# Altium footprint library General_Lib.PcbLib: 729 footprints (part 44 of 46)
Each footprint in its own frame and in the unit in brackets; x right, y up, seen from the top. Pads: shape width x height; smd on the part's side, far side on the other; paste and mask are expansions set on the pad; w line width, h text height; cw(c..) or ccw(c..) is an arc to the next point about the centre after c.
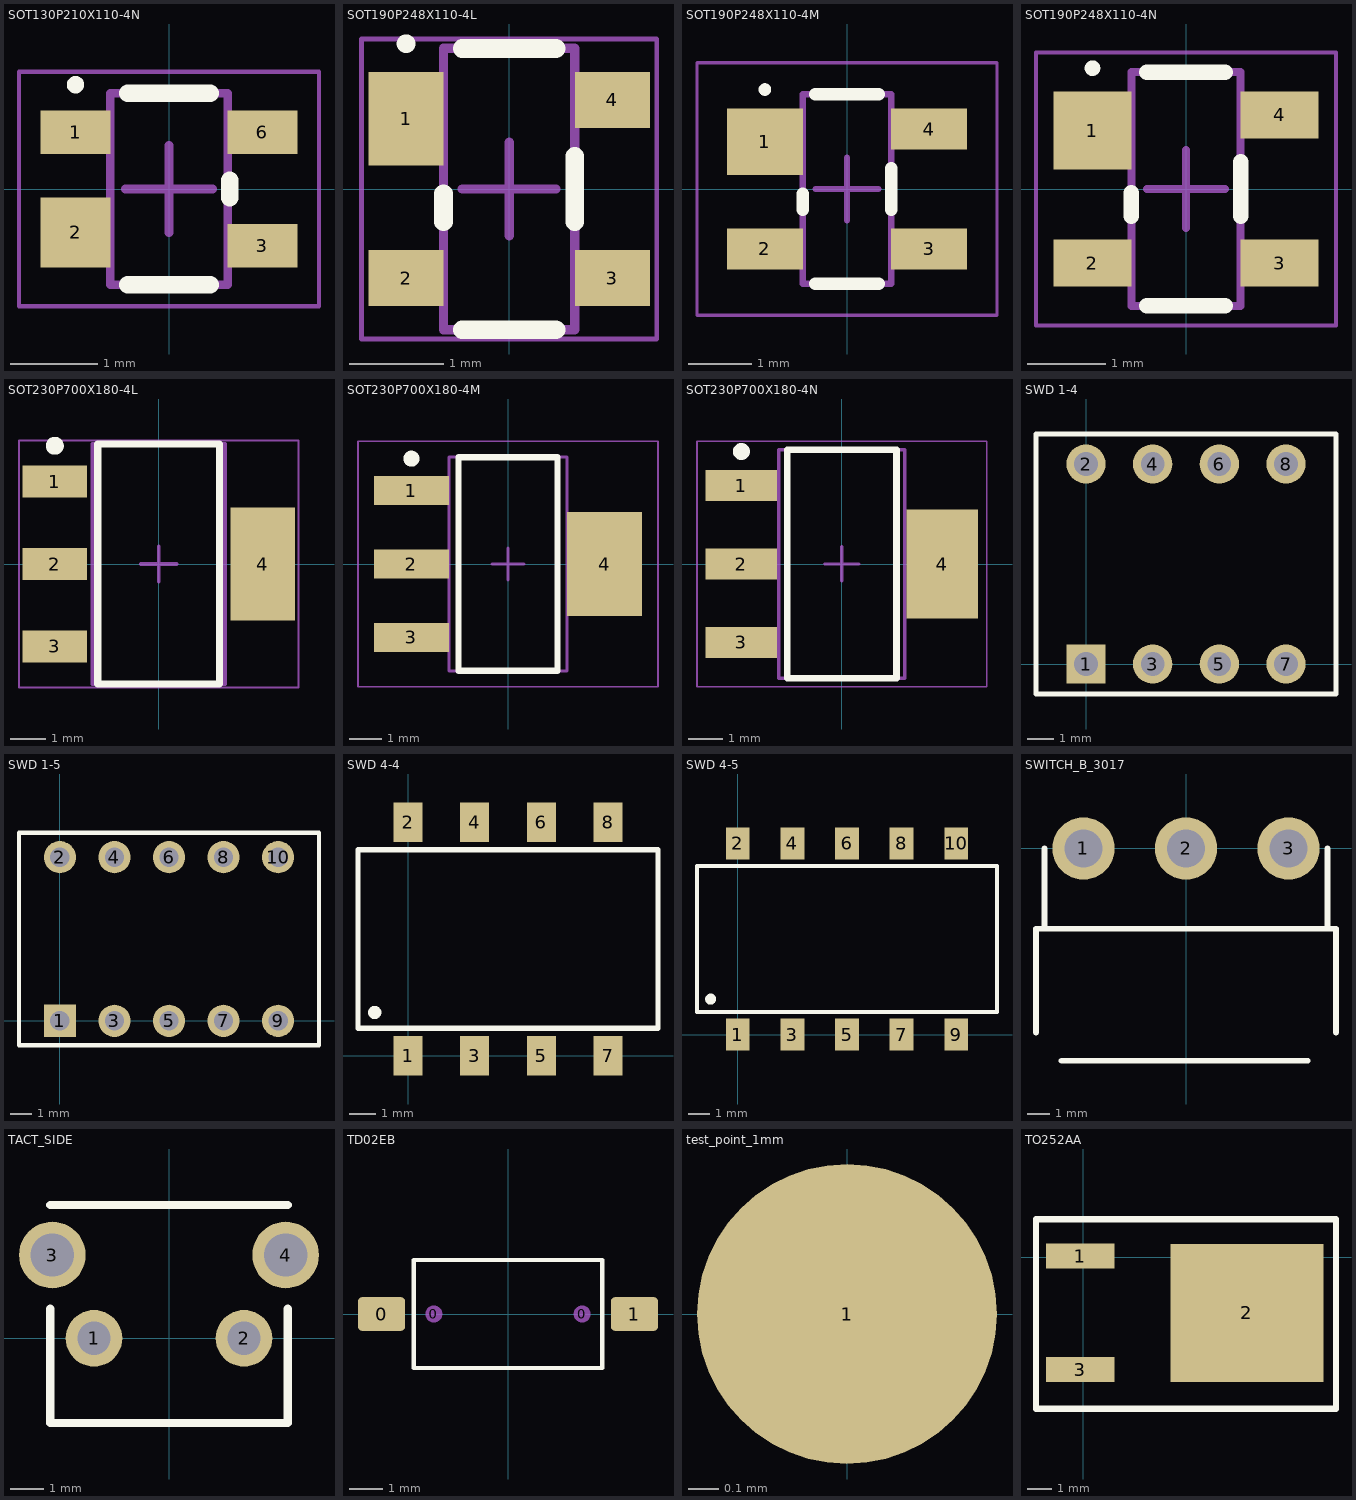
[diagram p43: the footprints below, top view; thin cyan lines are the x and y axes]

## SOT130P210X110-4N [mm] "SOT343, 4-Leads, Body 2,00x2,10mm, Pitch 1,30mm, IPC Medium Density"
height 1.1
pads (4):
  rect 0.8x0.5 smd: 1(-1.075,0.65) 3(1.075,-0.65) 6(1.075,0.65)
  rect 0.8x0.8 smd: 2(-1.075,-0.5)
Top Overlay:
  circle w0.1: c-1.075,1.2 r0.05
  lines w0.2: -0.475,-1.1 0.475,-1.1 ; -0.475,1.1 0.475,1.1 ; 0.7,-0.1 0.7,0.1
Mechanical 13:
  lines w0.1: -0.675,-1.1 0.675,-1.1 0.675,1.1 -0.675,1.1 -0.675,-1.1
Mechanical 15:
  lines w0.05: -1.725,-1.35 1.725,-1.35 1.725,1.35 -1.725,1.35 -1.725,-1.35
  lines w0.1: -0.5,0 0.5,0 ; 0,-0.5 0,0.5
3D body "SOT130P210X110-4N.step": height 1.1, standoff 0, extent -1.225,-1.1 1.225,1.1

## SOT190P248X110-4L [mm] "SOT143, 4-Leads, Body 2,90x2,48mm, Pitch 1,90mm, IPC High Density"
height 1.1
pads (4):
  rect 0.8x1 smd: 1(-1.1,0.75)
  rect 0.8x0.6 smd: 2(-1.1,-0.95) 3(1.1,-0.95) 4(1.1,0.95)
Top Overlay:
  circle w0.1: c-1.1,1.55 r0.05
  lines w0.2: -0.7,-0.35 -0.7,-0.05 ; -0.5,-1.5 0.5,-1.5 ; -0.5,1.5 0.5,1.5 ; 0.7,-0.35 0.7,0.35
Mechanical 13:
  lines w0.1: -0.7,-1.5 0.7,-1.5 0.7,1.5 -0.7,1.5 -0.7,-1.5
Mechanical 15:
  lines w0.05: -1.575,-1.6 1.575,-1.6 1.575,1.6 -1.575,1.6 -1.575,-1.6
  lines w0.1: -0.5,0 0.5,0 ; 0,-0.5 0,0.5
3D body "SOT190P248X110-4L.step": height 1.1, standoff 0, extent -1.238,-1.5 1.238,1.5

## SOT190P248X110-4M [mm] "SOT143, 4-Leads, Body 2,90x2,48mm, Pitch 1,90mm, IPC Low Density"
height 1.1
pads (4):
  rect 1.2x1.05 smd: 1(-1.3,0.75)
  rect 1.2x0.65 smd: 2(-1.3,-0.95) 3(1.3,-0.95) 4(1.3,0.95)
Top Overlay:
  circle w0.1: c-1.3,1.575 r0.05
  lines w0.2: -0.7,-0.325 -0.7,-0.075 ; -0.5,-1.5 0.5,-1.5 ; -0.5,1.5 0.5,1.5 ; 0.7,-0.325 0.7,0.325
Mechanical 13:
  lines w0.1: -0.7,-1.5 0.7,-1.5 0.7,1.5 -0.7,1.5 -0.7,-1.5
Mechanical 15:
  lines w0.05: -2.375,-2 2.375,-2 2.375,2 -2.375,2 -2.375,-2
  lines w0.1: -0.5,0 0.5,0 ; 0,-0.5 0,0.5
3D body "SOT190P248X110-4M.step": height 1.1, standoff 0, extent -1.238,-1.5 1.238,1.5

## SOT190P248X110-4N [mm] "SOT143, 4-Leads, Body 2,90x2,48mm, Pitch 1,90mm, IPC Medium Density"
height 1.1
pads (4):
  rect 1x1 smd: 1(-1.2,0.75)
  rect 1x0.6 smd: 2(-1.2,-0.95) 3(1.2,-0.95) 4(1.2,0.95)
Top Overlay:
  circle w0.1: c-1.2,1.55 r0.05
  lines w0.2: -0.7,-0.35 -0.7,-0.05 ; -0.5,-1.5 0.5,-1.5 ; -0.5,1.5 0.5,1.5 ; 0.7,-0.35 0.7,0.35
Mechanical 13:
  lines w0.1: -0.7,-1.5 -0.7,1.5 0.7,1.5 0.7,-1.5 -0.7,-1.5
Mechanical 15:
  lines w0.05: -1.925,-1.75 -1.925,1.75 1.925,1.75 1.925,-1.75 -1.925,-1.75
  lines w0.1: -0.5,0 0.5,0 ; 0,-0.5 0,0.5
3D body "SOT190P248X110-4N.step": height 1.1, standoff 0, extent -1.238,-1.5 1.238,1.5

## SOT230P700X180-4L [mm] "SOT223, 4-Leads, Body 6,50x7,00mm (avg), Pitch 2,30mm, IPC High Density"
height 1.8
pads (4):
  rect 1.8x0.9 smd: 1(-2.9,2.3) 2(-2.9,0) 3(-2.9,-2.3)
  rect 1.8x3.15 smd: 4(2.9,0)
Top Overlay:
  circle w0.25: c-2.9,3.3 r0.125
  lines w0.2: -1.7,-3.35 -1.7,3.35 1.7,3.35 1.7,-3.35 -1.7,-3.35
Mechanical 13:
  lines w0.1: -1.85,-3.35 -1.85,3.35 1.85,3.35 1.85,-3.35 -1.85,-3.35
Mechanical 15:
  lines w0.05: -3.9,-3.45 -3.9,3.45 3.9,3.45 3.9,-3.45 -3.9,-3.45
  lines w0.1: -0.5,0 0.5,0 ; 0,-0.5 0,0.5
3D body "SOT230P700X180-4L.step": height 1.8, standoff 0, extent -3.5,-3.35 3.5,3.35

## SOT230P700X180-4M [mm] "SOT223, 4-Leads, Body 6,50x7,00mm (avg), Pitch 2,30mm, IPC Low Density"
height 1.8
pads (4):
  rect 2.35x0.9 smd: 1(-3.025,2.3) 2(-3.025,0) 3(-3.025,-2.3)
  rect 2.35x3.25 smd: 4(3.025,0)
Top Overlay:
  circle w0.25: c-3.025,3.3 r0.125
  lines w0.2: -1.55,-3.35 1.55,-3.35 1.55,3.35 -1.55,3.35 -1.55,-3.35
Mechanical 13:
  lines w0.1: -1.85,-3.35 1.85,-3.35 1.85,3.35 -1.85,3.35 -1.85,-3.35
Mechanical 15:
  lines w0.05: -4.7,-3.85 4.7,-3.85 4.7,3.85 -4.7,3.85 -4.7,-3.85
  lines w0.1: -0.5,0 0.5,0 ; 0,-0.5 0,0.5
3D body "SOT230P700X180-4M.step": height 1.8, standoff 0, extent -3.5,-3.35 3.5,3.35

## SOT230P700X180-4N [mm] "SOT223, 4-Leads, Body 6,50x7,00mm (avg), Pitch 2,30mm, IPC Medium Density"
height 1.8
pads (4):
  rect 2.1x0.9 smd: 1(-2.95,2.3) 2(-2.95,0) 3(-2.95,-2.3)
  rect 2.1x3.2 smd: 4(2.95,0)
Top Overlay:
  circle w0.25: c-2.95,3.3 r0.125
  lines w0.2: -1.6,-3.35 -1.6,3.35 1.6,3.35 1.6,-3.35 -1.6,-3.35
Mechanical 13:
  lines w0.1: -1.85,-3.35 -1.85,3.35 1.85,3.35 1.85,-3.35 -1.85,-3.35
Mechanical 15:
  lines w0.05: -4.25,-3.6 -4.25,3.6 4.25,3.6 4.25,-3.6 -4.25,-3.6
  lines w0.1: -0.5,0 0.5,0 ; 0,-0.5 0,0.5
3D body "SOT230P700X180-4N.step": height 1.8, standoff 0, extent -3.5,-3.35 3.5,3.35

## SWD 1-4 [mm]
height 0.001
pads (8):
  rect 1.5x1.5 hole 0.9: 1(0,0)
  round 1.5 hole 0.9: 2(0,7.62) 3(2.54,0) 4(2.54,7.62) 5(5.08,0) 6(5.08,7.62) 7(7.62,0) 8(7.62,7.62)
Top Overlay:
  lines w0.2: -1.905,-1.14 -1.905,8.76 9.525,8.76 9.525,-1.14 -1.905,-1.14
3D body "SWD1-4.step": height 7, standoff -3.7, extent -1.77,-1.14 9.39,8.76

## SWD 1-5 [mm]
height 0.001
pads (10):
  rect 1.5x1.5 hole 0.9: 1(0,0)
  round 1.5 hole 0.9: 2(0,7.62) 3(2.54,0) 4(2.54,7.62) 5(5.08,0) 6(5.08,7.62) 7(7.62,0) 8(7.62,7.62) 9(10.16,0) 10(10.16,7.62)
Top Overlay:
  lines w0.2: -1.905,-1.14 -1.905,8.76 12.065,8.76 12.065,-1.14 -1.905,-1.14
3D body "SWD1-5.step": height 7, standoff -3.7, extent -1.778,-1.14 11.922,8.76

## SWD 4-4 [mm]
height 0.001
pads (8):
  rect 1.1x1.5 smd: 1(0,0) 2(0,8.9) 3(2.54,0) 4(2.54,8.9) 5(5.08,0) 6(5.08,8.9) 7(7.62,0) 8(7.62,8.9)
Top Overlay:
  circle w0.254: c-1.27,1.651 r0.127
  lines w0.2: -1.905,1.05 -1.905,7.85 9.525,7.85 9.525,1.05 -1.905,1.05
3D body "SWD4-4e.stp": height 4.4, standoff 0, extent -1.74,-0.455 9.36,9.345

## SWD 4-5 [mm]
height 0.001
pads (10):
  rect 1.1x1.5 smd: 1(0,0) 2(0,8.9) 3(2.54,0) 4(2.54,8.9) 5(5.08,0) 6(5.08,8.9) 7(7.62,0) 8(7.62,8.9) 9(10.16,0) 10(10.16,8.9)
Top Overlay:
  circle w0.254: c-1.27,1.651 r0.127
  lines w0.2: -1.905,1.05 -1.905,7.85 12.065,7.85 12.065,1.05 -1.905,1.05
3D body "SWD4-5e.stp": height 4.4, standoff 0, extent -1.74,-0.455 11.9,9.345

## SWITCH_B_3017 [mm]
pads (3):
  round 2.8 hole 1.7: 1(-4.6,0) 2(0,0) 3(4.6,0)
Top Overlay:
  lines w0.254: -6.731,-8.255 -6.731,-3.6 -6.35,-3.6 ; -6.35,0 -6.35,-3.6 ; -5.588,-9.525 5.461,-9.525 ; 6.35,0 6.35,-3.6 ; 6.731,-8.255 6.731,-3.6 6.35,-3.6 ; -6.35,-3.6 6.35,-3.6
3D body "User Library-1101M2S3ABE2.step": height 6.6, standoff -3.17, extent -6.804,-15.606 6.607,0.635

## TACT_SIDE [mm]
pads (4):
  round 1.7 hole 1: 1(-2.25,0) 2(2.25,0)
  round 2 hole 1.3: 3(-3.5,2.5) 4(3.5,2.5)
Top Overlay:
  lines w0.254: -3.556,0.889 -3.556,-2.54 -3.429,-2.54 3.556,-2.54 3.556,0.889 ; -3.556,4 3.556,4
3D body "TS-A4PV-130.STEP": height 8.01, standoff -3.51, extent -3.7,-10.89 3.7,4.01

## TD02EB [mm] "6x3.5mm SMD tact switch 2.5mm stem"
height 2.5
pads (4):
  rrect25% 1.4x1 smd: 0(-3.75,0) 1(3.75,0)
  round 0.508 on Mech15: 0(-2.2,0) 0(2.2,0)
Top Overlay:
  lines w0.127: -2.8,1.6 -2.793,-1.6 ; -2.794,-1.6 2.8,-1.6 2.8,1.6 -2.794,1.6
3D body "CircuitWorks-TACT SMD KWANDA TD-02EB.step": height 4.3, standoff -1, extent -4.025,-1.75 3.975,1.75

## test_point_1mm [mm]
pads (1):
  round 1 smd: 1(0,0)

## TO252AA [mm]
height 4
pads (3):
  rect 2.75x1 smd: 1(-0.12,0.04) 3(-0.12,-4.52)
  rect 6.15x5.55 smd: 2(6.58,-2.24)
Top Overlay:
  lines w0.254: -1.905,-6.096 10.16,-6.096 10.16,1.524 -1.905,1.524 -1.905,-6.096
3D body "User Library-DPAK-1.step": height 2.34, standoff -0.07, extent -0.985,-5.505 8.954,1.035